# Altium footprint library con-amp.PCBLIB: 295 footprints (part 3 of 19)
Each footprint in its own frame and in the unit in brackets; x right, y up, seen from the top. Pads: shape width x height; smd on the part's side, far side on the other; paste and mask are expansions set on the pad; w line width, h text height; cw(c..) or ccw(c..) is an arc to the next point about the centre after c.
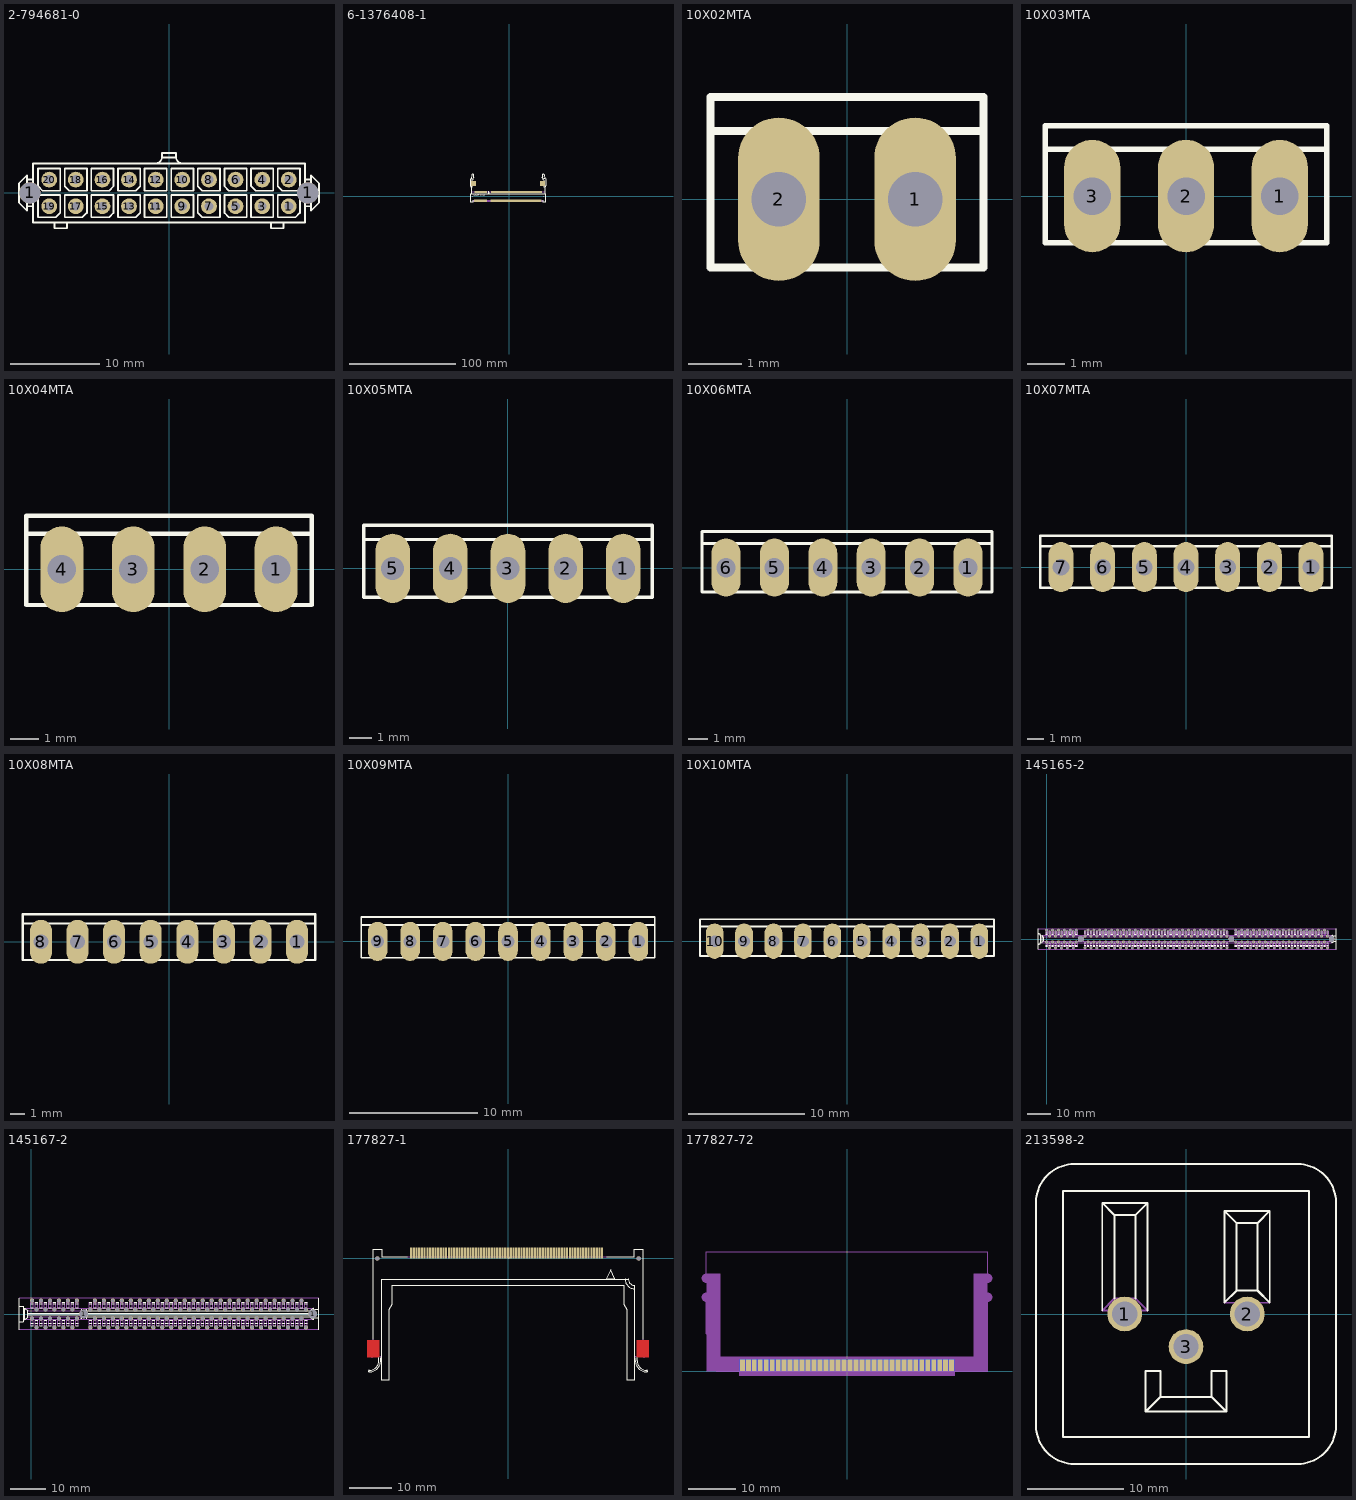
[diagram p2: the footprints below, top view; thin cyan lines are the x and y axes]

## 2-794681-0 [mil]
pads (22):
  round 94.49 hole 94.49: 1(-616.93,0) 1(615.35,0)
  round 70 hole 39.37: 1(531.5,-59.06) 2(531.5,59.06) 3(413.39,-59.06) 4(413.39,59.06) 5(295.28,-59.06) 6(295.28,59.06) 7(177.17,-59.06) 8(177.17,59.06) 9(59.06,-59.06) 10(59.06,59.06) 11(-59.06,-59.06) 12(-59.06,59.06) 13(-177.17,-59.06) 14(-177.17,59.06) 15(-295.28,-59.06) 16(-295.28,59.06) 17(-413.39,-59.06) 18(-413.39,59.06) 19(-531.5,-59.06) 20(-531.5,59.06)
Top Overlay:
  lines w8: -610.24,-59.06 -629.92,-59.06 ; -610.24,59.06 -629.92,59.06 ; -508.07,-135.43 -508.07,-157.09 -451.97,-157.09 -451.97,-135.43 ; -61.02,130.91 ccw(c-61.02,161.42) -30.51,161.42 -30.51,177.17 30.51,177.17 30.51,161.42 ccw(c61.02,161.42) 61.02,130.91 ; -29.53,157.48 29.53,157.48 ; 451.77,-134.84 451.77,-156.5 507.87,-156.5 507.87,-134.84 ; 610.24,-59.06 629.92,-59.06 ; 610.24,59.06 629.92,59.06 ; -629.92,-59.06 -629.92,59.06 ; -629.92,-59.06 -629.92,-78.74 -665.35,-43.31 -665.35,43.31 -629.92,78.74 -629.92,59.06 ; 629.92,-59.06 629.92,59.06 ; 629.92,-59.06 629.92,-78.74 665.35,-43.31 665.35,43.31 629.92,78.74 629.92,59.06 ; -603.35,-130.91 603.35,-130.91 603.35,130.91 -603.35,130.91 -603.35,-130.91 ; -580.71,-108.27 -580.71,-9.84 -482.28,-9.84 -482.28,-88.58 -501.97,-108.27 -580.71,-108.27 ; -580.71,29.53 -580.71,108.27 -482.28,108.27 -482.28,9.84 -561.02,9.84 -580.71,29.53 ; -462.6,-108.27 -383.86,-108.27 -364.17,-88.58 -364.17,-9.84 -462.6,-9.84 -462.6,-108.27 ; -462.6,29.53 -462.6,108.27 -364.17,108.27 -364.17,9.84 -442.91,9.84 -462.6,29.53 ; -344.49,-108.27 -344.49,-9.84 -246.06,-9.84 -246.06,-88.58 -265.75,-108.27 -344.49,-108.27 ; -344.49,9.84 -265.75,9.84 -246.06,29.53 -246.06,108.27 -344.49,108.27 -344.49,9.84 ; -226.38,-108.27 -147.64,-108.27 -127.95,-88.58 -127.95,-9.84 -226.38,-9.84 -226.38,-108.27 ; -226.38,9.84 -147.64,9.84 -127.95,29.53 -127.95,108.27 -226.38,108.27 -226.38,9.84 ; -108.27,-108.27 -9.84,-108.27 -9.84,-9.84 -108.27,-9.84 -108.27,-108.27 ; -108.27,9.84 -9.84,9.84 -9.84,108.27 -108.27,108.27 -108.27,9.84 ; 9.84,-108.27 108.27,-108.27 108.27,-9.84 9.84,-9.84 9.84,-108.27 ; 9.84,9.84 108.27,9.84 108.27,108.27 9.84,108.27 9.84,9.84 ; 127.95,-88.58 127.95,-9.84 226.38,-9.84 226.38,-108.27 147.64,-108.27 127.95,-88.58 ; 127.95,29.53 127.95,108.27 226.38,108.27 226.38,9.84 147.64,9.84 127.95,29.53 ; 246.06,-88.58 246.06,-9.84 344.49,-9.84 344.49,-108.27 265.75,-108.27 246.06,-88.58 ; 246.06,29.53 246.06,108.27 344.49,108.27 344.49,9.84 265.75,9.84 246.06,29.53 ; 364.17,-108.27 364.17,-9.84 462.6,-9.84 462.6,-108.27 364.17,-108.27 ; 364.17,29.53 364.17,108.27 462.6,108.27 462.6,9.84 383.86,9.84 364.17,29.53 ; 482.28,-108.27 482.28,-9.84 580.71,-9.84 580.71,-88.58 561.02,-108.27 482.28,-108.27 ; 482.28,29.53 482.28,108.27 580.71,108.27 580.71,9.84 501.97,9.84 482.28,29.53

## 6-1376408-1 [mm]
pads (204):
  round 0.6 hole 0.6: 1(-34.4,0)
  rect 0.35x2 smd: 1(-32.65,-4.1) 2(-32.35,4.1) 3(-32.05,-4.1) 4(-31.75,4.1) 5(-31.45,-4.1) 6(-31.15,4.1) 7(-30.85,-4.1) 8(-30.55,4.1) 9(-30.25,-4.1) 10(-29.95,4.1) 11(-29.65,-4.1) 12(-29.35,4.1) 13(-29.05,-4.1) 14(-28.75,4.1) 15(-28.45,-4.1) 16(-28.15,4.1) 17(-27.85,-4.1) 18(-27.55,4.1) 19(-27.25,-4.1) 20(-26.95,4.1) 21(-26.65,-4.1) 22(-26.35,4.1) 23(-26.05,-4.1) 24(-25.75,4.1) 25(-25.45,-4.1) 26(-25.15,4.1) 27(-24.85,-4.1) 28(-24.55,4.1) 29(-24.25,-4.1) 30(-23.95,4.1) 31(-23.65,-4.1) 32(-23.35,4.1) 33(-23.05,-4.1) 34(-22.75,4.1) 35(-22.45,-4.1) 36(-22.15,4.1) 37(-21.85,-4.1) 38(-21.55,4.1) 39(-21.25,-4.1) 40(-20.95,4.1) 41(-17.05,-4.1) 42(-16.75,4.1) 43(-16.45,-4.1) 44(-16.15,4.1) 45(-15.85,-4.1) 46(-15.55,4.1) 47(-15.25,-4.1) 48(-14.95,4.1) 49(-14.65,-4.1) 50(-14.35,4.1) 51(-14.05,-4.1) 52(-13.75,4.1) 53(-13.45,-4.1) 54(-13.15,4.1) 55(-12.85,-4.1) 56(-12.55,4.1) 57(-12.25,-4.1) 58(-11.95,4.1) 59(-11.65,-4.1) 60(-11.35,4.1) 61(-11.05,-4.1) 62(-10.75,4.1) 63(-10.45,-4.1) 64(-10.15,4.1) 65(-9.85,-4.1) 66(-9.55,4.1) 67(-9.25,-4.1) 68(-8.95,4.1) 69(-8.65,-4.1) 70(-8.35,4.1) 71(-8.05,-4.1) 72(-7.75,4.1) 73(-7.45,-4.1) 74(-7.15,4.1) 75(-6.85,-4.1) 76(-6.55,4.1) 77(-6.25,-4.1) 78(-5.95,4.1) 79(-5.65,-4.1) 80(-5.35,4.1) 81(-5.05,-4.1) 82(-4.75,4.1) 83(-4.45,-4.1) 84(-4.15,4.1) 85(-3.85,-4.1) 86(-3.55,4.1) 87(-3.25,-4.1) 88(-2.95,4.1) 89(-2.65,-4.1) 90(-2.35,4.1) 91(-2.05,-4.1) 92(-1.75,4.1) 93(-1.45,-4.1) 94(-1.15,4.1) 95(-0.85,-4.1) 96(-0.55,4.1) 97(-0.25,-4.1) 98(0.05,4.1) 99(0.35,-4.1) 100(0.65,4.1) 101(0.95,-4.1) 102(1.25,4.1) 103(1.55,-4.1) 104(1.85,4.1) 105(2.15,-4.1) 106(2.45,4.1) 107(2.75,-4.1) 108(3.05,4.1) 109(3.35,-4.1) 110(3.65,4.1) 111(3.95,-4.1) 112(4.25,4.1) 113(4.55,-4.1) 114(4.85,4.1) 115(5.15,-4.1) 116(5.45,4.1) 117(5.75,-4.1) 118(6.05,4.1) 119(6.35,-4.1) 120(6.65,4.1) 121(6.95,-4.1) 122(7.25,4.1) 123(7.55,-4.1) 124(7.85,4.1) 125(8.15,-4.1) 126(8.45,4.1) 127(8.75,-4.1) 128(9.05,4.1) 129(9.35,-4.1) 130(9.65,4.1) 131(9.95,-4.1) 132(10.25,4.1) 133(10.55,-4.1) 134(10.85,4.1) 135(11.15,-4.1) 136(11.45,4.1) 137(11.75,-4.1) 138(12.05,4.1) 139(12.35,-4.1) 140(12.65,4.1) 141(12.95,-4.1) 142(13.25,4.1) 143(13.55,-4.1) 144(13.85,4.1) 145(14.15,-4.1) 146(14.45,4.1) 147(14.75,-4.1) 148(15.05,4.1) 149(15.35,-4.1) 150(15.65,4.1) 151(15.95,-4.1) 152(16.25,4.1) 153(16.55,-4.1) 154(16.85,4.1) 155(17.15,-4.1) 156(17.45,4.1) 157(17.75,-4.1) 158(18.05,4.1) 159(18.35,-4.1) 160(18.65,4.1) 161(18.95,-4.1) 162(19.25,4.1) 163(19.55,-4.1) 164(19.85,4.1) 165(20.15,-4.1) 166(20.45,4.1) 167(20.75,-4.1) 168(21.05,4.1) 169(21.35,-4.1) 170(21.65,4.1) 171(21.95,-4.1) 172(22.25,4.1) 173(22.55,-4.1) 174(22.85,4.1) 175(23.15,-4.1) 176(23.45,4.1) 177(23.75,-4.1) 178(24.05,4.1) 179(24.35,-4.1) 180(24.65,4.1) 181(24.95,-4.1) 182(25.25,4.1) 183(25.55,-4.1) 184(25.85,4.1) 185(26.15,-4.1) 186(26.45,4.1) 187(26.75,-4.1) 188(27.05,4.1) 189(27.35,-4.1) 190(27.65,4.1) 191(27.95,-4.1) 192(28.25,4.1) 193(28.55,-4.1) 194(28.85,4.1) 195(29.15,-4.1) 196(29.45,4.1) 197(29.75,-4.1) 198(30.05,4.1) 199(30.35,-4.1) 200(30.65,4.1)
  round 1.1 hole 1.1: 1(32.4,0)
  rect 4.5x4.6 smd: M1(-33.55,12) M2(31.55,12)
Top Overlay:
  region: 0,0 0.254,0 0.254,0.254 0,0.254
  lines w0.203: -36.65,16.35 -36.65,9.9 -35.5,8.55 -35.5,1.85 ; -35.25,8.45 cw(c52.49,6.921) -34.75,16.4 ; -33.65,-3.8 -33.65,-4.9 -36.45,-4.9 -36.45,1.75 34.45,1.75 34.45,-4.9 31.65,-4.9 31.65,-3.8 ; -19.8,1.85 -19.8,3.85 cw(c-19.45,3.825) -19.1,3.85 -19.1,1.85 ; 33.25,8.45 ccw(c-54.49,6.921) 32.75,16.4 ; 33.5,1.85 33.5,8.55 34.65,9.9 34.65,16.35 ; -34.75,16.4 -33.85,16.25 -33.25,17.85 -33.85,18.05 cw(c-33.795,18.198) -33.75,18.35 -33.15,18.15 ccw(c-38.2,18.8) -33.35,20.35 ccw(c-34.199,19.968) -35.1,20.2 -35.45,16.55 -34.75,16.4 ; 32.75,16.4 31.85,16.25 31.25,17.85 31.85,18.05 ccw(c31.795,18.198) 31.75,18.35 31.15,18.15 cw(c36.2,18.8) 31.35,20.35 cw(c32.199,19.968) 33.1,20.2 33.45,16.55 32.75,16.4
  text "DDR STD" at -33.25,-0.75 h2.76
Mechanical 16:
  lines w0.203: -35.4,4.4 33.4,4.4 ; -33.65,-3.8 31.65,-3.8 ; -33.55,-4.4 31.55,-4.4

## 10X02MTA [mil]
pads (2):
  oval 60x120 hole 40: 1(50,0) 2(-50,0)
Top Overlay:
  rectangle: 40,-10 60,10
  rectangle: -60,-10 -40,10
  lines w6: -100,50 -100,-50 100,-50 100,50 ; -100,50 100,50 ; -100,50 -100,75 100,75 100,50

## 10X03MTA [mil]
pads (3):
  oval 60x120 hole 40: 1(100,0) 2(0,0) 3(-100,0)
Top Overlay:
  rectangle: 90,-10 110,10
  rectangle: -10,-10 10,10
  rectangle: -110,-10 -90,10
  lines w6: -150,50 -150,-50 150,-50 150,50 ; -150,50 150,50 ; -150,50 -150,75 150,75 150,50

## 10X04MTA [mil]
pads (4):
  oval 60x120 hole 40: 1(150,0) 2(50,0) 3(-50,0) 4(-150,0)
Top Overlay:
  rectangle: -60,-10 -40,10
  rectangle: 40,-10 60,10
  rectangle: 140,-10 160,10
  rectangle: -160,-10 -140,10
  lines w6: -200,50 -200,-50 200,-50 200,50 ; -200,50 200,50 ; -200,50 -200,75 200,75 200,50

## 10X05MTA [mil]
pads (5):
  oval 60x120 hole 40: 1(200,0) 2(100,0) 3(0,0) 4(-100,0) 5(-200,0)
Top Overlay:
  rectangle: -10,-10 10,10
  rectangle: -110,-10 -90,10
  rectangle: -210,-10 -190,10
  rectangle: 90,-10 110,10
  rectangle: 190,-10 210,10
  lines w6: -250,50 -250,-50 250,-50 250,50 ; -250,50 250,50 ; -250,50 -250,75 250,75 250,50

## 10X06MTA [mil]
pads (6):
  oval 60x120 hole 40: 1(250,0) 2(150,0) 3(50,0) 4(-50,0) 5(-150,0) 6(-250,0)
Top Overlay:
  rectangle: -60,-10 -40,10
  rectangle: -160,-10 -140,10
  rectangle: -260,-10 -240,10
  rectangle: 40,-10 60,10
  rectangle: 140,-10 160,10
  rectangle: 240,-10 260,10
  lines w6: -300,50 -300,-50 300,-50 300,50 ; -300,50 300,50 ; -300,50 -300,75 300,75 300,50

## 10X07MTA [mil]
pads (7):
  oval 60x120 hole 40: 1(300,0) 2(200,0) 3(100,0) 4(0,0) 5(-100,0) 6(-200,0) 7(-300,0)
Top Overlay:
  rectangle: -110,-10 -90,10
  rectangle: -210,-10 -190,10
  rectangle: -310,-10 -290,10
  rectangle: -10,-10 10,10
  rectangle: 90,-10 110,10
  rectangle: 190,-10 210,10
  rectangle: 290,-10 310,10
  lines w6: -350,50 -350,-50 350,-50 350,50 ; -350,50 350,50 ; -350,50 -350,75 350,75 350,50

## 10X08MTA [mil]
pads (8):
  oval 60x120 hole 40: 1(350,0) 2(250,0) 3(150,0) 4(50,0) 5(-50,0) 6(-150,0) 7(-250,0) 8(-350,0)
Top Overlay:
  rectangle: -60,-10 -40,10
  rectangle: -160,-10 -140,10
  rectangle: -260,-10 -240,10
  rectangle: 40,-10 60,10
  rectangle: 140,-10 160,10
  rectangle: 240,-10 260,10
  rectangle: 340,-10 360,10
  rectangle: -360,-10 -340,10
  lines w6: -400,50 -400,-50 400,-50 400,50 ; -400,50 400,50 ; -400,50 -400,75 400,75 400,50

## 10X09MTA [mil]
pads (9):
  oval 60x120 hole 40: 1(400,0) 2(300,0) 3(200,0) 4(100,0) 5(0,0) 6(-100,0) 7(-200,0) 8(-300,0) 9(-400,0)
Top Overlay:
  rectangle: -10,-10 10,10
  rectangle: -110,-10 -90,10
  rectangle: -210,-10 -190,10
  rectangle: 90,-10 110,10
  rectangle: 190,-10 210,10
  rectangle: 290,-10 310,10
  rectangle: 390,-10 410,10
  rectangle: -310,-10 -290,10
  rectangle: -410,-10 -390,10
  lines w6: -450,50 -450,-50 450,-50 450,50 ; -450,50 450,50 ; -450,50 -450,75 450,75 450,50

## 10X10MTA [mil]
pads (10):
  oval 60x120 hole 40: 1(450,0) 2(350,0) 3(250,0) 4(150,0) 5(50,0) 6(-50,0) 7(-150,0) 8(-250,0) 9(-350,0) 10(-450,0)
Top Overlay:
  rectangle: 40,-10 60,10
  rectangle: -60,-10 -40,10
  rectangle: -160,-10 -140,10
  rectangle: 140,-10 160,10
  rectangle: 240,-10 260,10
  rectangle: 340,-10 360,10
  rectangle: 440,-10 460,10
  rectangle: -260,-10 -240,10
  rectangle: -360,-10 -340,10
  rectangle: -460,-10 -440,10
  lines w6: -500,50 -500,-50 500,-50 500,50 ; -500,50 500,50 ; -500,50 -500,75 500,75 500,50

## 145165-2 [mm]
pads (187):
  round 1.2 hole 1: 1(0,-1.27) 2(0,3.81) 3(1.27,-3.81) 4(1.27,1.27) 5(2.54,-1.27) 6(2.54,3.81) 7(3.81,-3.81) 8(3.81,1.27) 9(5.08,-1.27) 10(5.08,3.81) 11(6.35,-3.81) 12(6.35,1.27) 13(7.62,-1.27) 14(7.62,3.81) 15(8.89,-3.81) 16(8.89,1.27) 17(10.16,-1.27) 18(10.16,3.81) 19(11.43,-3.81) 20(11.43,1.27) 21(12.7,-1.27) 22(12.7,3.81) 23(16.51,-3.81) 24(16.51,1.27) 25(17.78,-1.27) 26(17.78,3.81) 27(19.05,-3.81) 28(19.05,1.27) 29(20.32,-1.27) 30(20.32,3.81) 31(21.59,-3.81) 32(21.59,1.27) 33(22.86,-1.27) 34(22.86,3.81) 35(24.13,-3.81) 36(24.13,1.27) 37(25.4,-1.27) 38(25.4,3.81) 39(26.67,-3.81) 40(26.67,1.27) 41(27.94,-1.27) 42(27.94,3.81) 43(29.21,-3.81) 44(29.21,1.27) 45(30.48,-1.27) 46(30.48,3.81) 47(31.75,-3.81) 48(31.75,1.27) 49(33.02,-1.27) 50(33.02,3.81) 51(34.29,-3.81) 52(34.29,1.27) 53(35.56,-1.27) 54(35.56,3.81) 55(36.83,-3.81) 56(36.83,1.27) 57(38.1,-1.27) 58(38.1,3.81) 59(39.37,-3.81) 60(39.37,1.27) 61(40.64,-1.27) 62(40.64,3.81) 63(41.91,-3.81) 64(41.91,1.27) 65(43.18,-1.27) 66(43.18,3.81) 67(44.45,-3.81) 68(44.45,1.27) 69(45.72,-1.27) 70(45.72,3.81) 71(46.99,-3.81) 72(46.99,1.27) 73(48.26,-1.27) 74(48.26,3.81) 75(49.53,-3.81) 76(49.53,1.27) 77(50.8,-1.27) 78(50.8,3.81) 79(52.07,-3.81) 80(52.07,1.27) 81(53.34,-1.27) 82(53.34,3.81) 83(54.61,-3.81) 84(54.61,1.27) 85(55.88,-1.27) 86(55.88,3.81) 87(57.15,-3.81) 88(57.15,1.27) 89(58.42,-1.27) 90(58.42,3.81) 91(59.69,-3.81) 92(59.69,1.27) 93(60.96,-1.27) 94(60.96,3.81) 95(62.23,-3.81) 96(62.23,1.27) 97(63.5,-1.27) 98(63.5,3.81) 99(64.77,-3.81) 100(64.77,1.27) 101(66.04,-1.27) 102(66.04,3.81) 103(67.31,-3.81) 104(67.31,1.27) 105(68.58,-1.27) 106(68.58,3.81) 107(69.85,-3.81) 108(69.85,1.27) 109(71.12,-1.27) 110(71.12,3.81) 111(72.39,-3.81) 112(72.39,1.27) 113(73.66,-1.27) 114(73.66,3.81) 115(74.93,-3.81) 116(74.93,1.27) 117(76.2,-1.27) 118(76.2,3.81) 119(77.47,-3.81) 120(77.47,1.27) 121(81.28,-1.27) 122(81.28,3.81) 123(82.55,-3.81) 124(82.55,1.27) 125(83.82,-1.27) 126(83.82,3.81) 127(85.09,-3.81) 128(85.09,1.27) 129(86.36,-1.27) 130(86.36,3.81) 131(87.63,-3.81) 132(87.63,1.27) 133(88.9,-1.27) 134(88.9,3.81) 135(90.17,-3.81) 136(90.17,1.27) 137(91.44,-1.27) 138(91.44,3.81) 139(92.71,-3.81) 140(92.71,1.27) 141(93.98,-1.27) 142(93.98,3.81) 143(95.25,-3.81) 144(95.25,1.27) 145(96.52,-1.27) 146(96.52,3.81) 147(97.79,-3.81) 148(97.79,1.27) 149(99.06,-1.27) 150(99.06,3.81) 151(100.33,-3.81) 152(100.33,1.27) 153(101.6,-1.27) 154(101.6,3.81) 155(102.87,-3.81) 156(102.87,1.27) 157(104.14,-1.27) 158(104.14,3.81) 159(105.41,-3.81) 160(105.41,1.27) 161(106.68,-1.27) 162(106.68,3.81) 163(107.95,-3.81) 164(107.95,1.27) 165(109.22,-1.27) 166(109.22,3.81) 167(110.49,-3.81) 168(110.49,1.27) 169(111.76,-1.27) 170(111.76,3.81) 171(113.03,-3.81) 172(113.03,1.27) 173(114.3,-1.27) 174(114.3,3.81) 175(115.57,-3.81) 176(115.57,1.27) 177(116.84,-1.27) 178(116.84,3.81) 179(118.11,-3.81) 180(118.11,1.27) 181(119.38,-1.27) 182(119.38,3.81) 183(120.65,-3.81) 184(120.65,1.27)
  round 2.44 hole 2.44: 1(14.6,0) 1(79.37,0) 1(122.55,0)
Top Overlay:
  drawing of 393 lines, arcs and shapes, not listed
Mechanical 16:
  drawing of 563 lines, arcs and shapes, not listed

## 145167-2 [mil]
pads (122):
  round 47.24 hole 39.37: 1(10,-50) 2(10,150) 3(60,-150) 4(60,50) 5(110,-50) 6(110,150) 7(160,-150) 8(160,50) 9(210,-50) 10(210,150) 11(260,-150) 12(260,50) 13(310,-50) 14(310,150) 15(360,-150) 16(360,50) 17(410,-50) 18(410,150) 19(460,-150) 20(460,50) 21(510,-50) 22(510,150) 23(660,-150) 24(660,50) 25(710,-50) 26(710,150) 27(760,-150) 28(760,50) 29(810,-50) 30(810,150) 31(860,-150) 32(860,50) 33(910,-50) 34(910,150) 35(960,-150) 36(960,50) 37(1010,-50) 38(1010,150) 39(1060,-150) 40(1060,50) 41(1110,-50) 42(1110,150) 43(1160,-150) 44(1160,50) 45(1210,-50) 46(1210,150) 47(1260,-150) 48(1260,50) 49(1310,-50) 50(1310,150) 51(1360,-150) 52(1360,50) 53(1410,-50) 54(1410,150) 55(1460,-150) 56(1460,50) 57(1510,-50) 58(1510,150) 59(1560,-150) 60(1560,50) 61(1610,-50) 62(1610,150) 63(1660,-150) 64(1660,50) 65(1710,-50) 66(1710,150) 67(1760,-150) 68(1760,50) 69(1810,-50) 70(1810,150) 71(1860,-150) 72(1860,50) 73(1910,-50) 74(1910,150) 75(1960,-150) 76(1960,50) 77(2010,-50) 78(2010,150) 79(2060,-150) 80(2060,50) 81(2110,-50) 82(2110,150) 83(2160,-150) 84(2160,50) 85(2210,-50) 86(2210,150) 87(2260,-150) 88(2260,50) 89(2310,-50) 90(2310,150) 91(2360,-150) 92(2360,50) 93(2410,-50) 94(2410,150) 95(2460,-150) 96(2460,50) 97(2510,-50) 98(2510,150) 99(2560,-150) 100(2560,50) 101(2610,-50) 102(2610,150) 103(2660,-150) 104(2660,50) 105(2710,-50) 106(2710,150) 107(2760,-150) 108(2760,50) 109(2810,-50) 110(2810,150) 111(2860,-150) 112(2860,50) 113(2910,-50) 114(2910,150) 115(2960,-150) 116(2960,50) 117(3010,-50) 118(3010,150) 119(3060,-150) 120(3060,50)
  round 96.06 hole 96.06: 1(584.8,0) 1(3134.8,0)
Top Overlay:
  drawing of 280 lines, arcs and shapes, not listed
Mechanical 16:
  drawing of 366 lines, arcs and shapes, not listed

## 177827-1 [mil]
pads (74):
  round 40 hole 40: 1(-1215,0) 1(1215,0)
  rect 20x100 smd: 1(875,50) 2(850,50) 3(825,50) 4(800,50) 5(775,50) 6(750,50) 7(725,50) 8(700,50) 9(675,50) 10(650,50) 11(625,50) 12(600,50) 13(575,50) 14(550,50) 15(525,50) 16(500,50) 17(475,50) 18(450,50) 19(425,50) 20(400,50) 21(375,50) 22(350,50) 23(325,50) 24(300,50) 25(275,50) 26(250,50) 27(225,50) 28(200,50) 29(175,50) 30(150,50) 31(125,50) 32(100,50) 33(75,50) 34(50,50) 35(25,50) 36(0,50) 37(-25,50) 38(-50,50) 39(-75,50) 40(-100,50) 41(-125,50) 42(-150,50) 43(-175,50) 44(-200,50) 45(-225,50) 46(-250,50) 47(-275,50) 48(-300,50) 49(-325,50) 50(-350,50) 51(-375,50) 52(-400,50) 53(-425,50) 54(-450,50) 55(-475,50) 56(-500,50) 57(-525,50) 58(-550,50) 59(-575,50) 60(-600,50) 61(-625,50) 62(-650,50) 63(-675,50) 64(-700,50) 65(-725,50) 66(-750,50) 67(-775,50) 68(-800,50) 69(-825,50) 70(-850,50) 71(-875,50) 72(-900,50)
Top Layer:
  rectangle: -1313,-920 -1196,-760
  rectangle: 1196,-920 1313,-760
Top Overlay:
  region: 0,0 10,0 10,10 0,10
  lines w10: -1255,-750 -1255,86 -1173,86 -1173,15 -935,15 ; -1200,-925 -1200,-950 cw(c-1290,-950) -1290,-1040 ccw(c-1290,-1047.5) -1290,-1055 ccw(c-1290,-950) -1185,-950 -1185,-925 ; 920,15 1173,15 1173,86 1255,86 1255,-750 ; 1090,-190 ccw(c1175,-194.86) 1175,-280 ; 1120,-192 -1175,-192 -1175,-1133 -1105,-1133 -1105,-473 -1075,-426 -1075,-251 1075,-251 1075,-425 1105,-473 1105,-1133 1175,-1133 1175,-280 ; 1120,-190 ccw(c1175,-194.79) 1175,-250 ; 1175,-249 1175,-250 ; 1185,-925 1185,-950 ccw(c1290,-950) 1290,-1055 ccw(c1290,-1047.5) 1290,-1040 cw(c1290,-950) 1200,-950 1200,-925 ; 1175,-280 1175,-250 ; 915,-190 955,-105 995,-190 915,-190
Top Paste:
  rectangle: 1225.39,-908.46 1299.21,-767.72
  rectangle: -1300.2,-909.45 -1226.38,-768.7
Top Solder:
  rectangle: -1314.96,-921.26 -1193.9,-757.87
  rectangle: 1193.9,-922.24 1314.96,-758.86
Mechanical 16:
  lines w10: -1260,-915 cw(c-1260,-880) -1295,-880 -1295,-800 cw(c-1260,-800) -1260,-765 ; -1255,-750 -1255,-914 -1175,-914 ; -935,15 920,15 ; 1175,-914 1255,-914 1255,-750 ; 1260,-915 ccw(c1260,-880) 1295,-880 1295,-800 ccw(c1260,-800) 1260,-765

## 177827-72 [mm]
pads (72):
  rect 1.04x2.4 smd: 1(-22.225,1.35) 3(-20.955,1.35) 5(-19.685,1.35) 7(-18.415,1.35) 9(-17.145,1.35) 11(-15.875,1.35) 13(-14.605,1.35) 15(-13.335,1.35) 17(-12.065,1.35) 19(-10.795,1.35) 21(-9.525,1.35) 23(-8.255,1.35) 25(-6.985,1.35) 27(-5.715,1.35) 29(-4.445,1.35) 31(-3.175,1.35) 33(-1.905,1.35) 35(-0.635,1.35) 37(0.635,1.35) 39(1.905,1.35) 41(3.175,1.35) 43(4.445,1.35) 45(5.715,1.35) 47(6.985,1.35) 49(8.255,1.35) 51(9.525,1.35) 53(10.795,1.35) 55(12.065,1.35) 57(13.335,1.35) 59(14.605,1.35) 61(15.875,1.35) 63(17.145,1.35) 65(18.415,1.35) 67(19.685,1.35) 69(20.955,1.35) 71(22.225,1.35)
  rect 1.04x2.4 smd far side: 2(-22.225,1.35) 4(-20.955,1.35) 6(-19.685,1.35) 8(-18.415,1.35) 10(-17.145,1.35) 12(-15.875,1.35) 14(-14.605,1.35) 16(-13.335,1.35) 18(-12.065,1.35) 20(-10.795,1.35) 22(-9.525,1.35) 24(-8.255,1.35) 26(-6.985,1.35) 28(-5.715,1.35) 30(-4.445,1.35) 32(-3.175,1.35) 34(-1.905,1.35) 36(-0.635,1.35) 38(0.635,1.35) 40(1.905,1.35) 42(3.175,1.35) 44(4.445,1.35) 46(5.715,1.35) 48(6.985,1.35) 50(8.255,1.35) 52(9.525,1.35) 54(10.795,1.35) 56(12.065,1.35) 58(13.335,1.35) 60(14.605,1.35) 62(15.875,1.35) 64(17.145,1.35) 66(18.415,1.35) 68(19.685,1.35) 70(20.955,1.35) 72(22.225,1.35)
Mechanical 1:
  lines w0: 29.84,15.78 cw(c29.84,17.78) 29.84,19.78 ; 29.845,15.78 29.845,0 -27.815,0 -27.815,6.43 ccw(c-29.385,6.43) -29.385,8 -29.845,8 -29.845,15.78 ccw(c-29.845,17.78) -29.845,19.78 -29.845,25.4 29.845,25.4 29.845,19.78
Mechanical 23:
  rectangle: -22.9,-1 22.9,2.7
Mechanical 24:
  rectangle: -22.9,-1 22.9,2.7
Mechanical 27:
  rectangle: -27.81,0 29.84,3.15
  lines w2: -29.85,15.8 ccw(c-29.85,17.8) -29.85,19.8 ; 29.85,15.8 cw(c29.85,17.8) 29.85,19.8
Mechanical 28:
  rectangle: -29.85,0 -26.85,20.8
  rectangle: 26.85,0 29.85,20.8
  rectangle: -27.8,0 29.85,3.15

## 213598-2 [mil]
pads (3):
  round 141.73 hole 102.36: 1(-250,0) 2(250,0) 3(0,-133.07)
Top Overlay:
  drawing of 259 lines, arcs and shapes, not listed
Mechanical 16:
  lines w8: 156.99,46.01 341.99,46.01 ; -342.01,13.5 -292.01,63.5 -207.01,63.5 -157.01,13.5 -342.01,13.5